# Altium footprint library CUSTOM PCB.PcbLib: 404 footprints (part 17 of 26)
Each footprint in its own frame and in the unit in brackets; x right, y up, seen from the top. Pads: shape width x height; smd on the part's side, far side on the other; paste and mask are expansions set on the pad; w line width, h text height; cw(c..) or ccw(c..) is an arc to the next point about the centre after c.
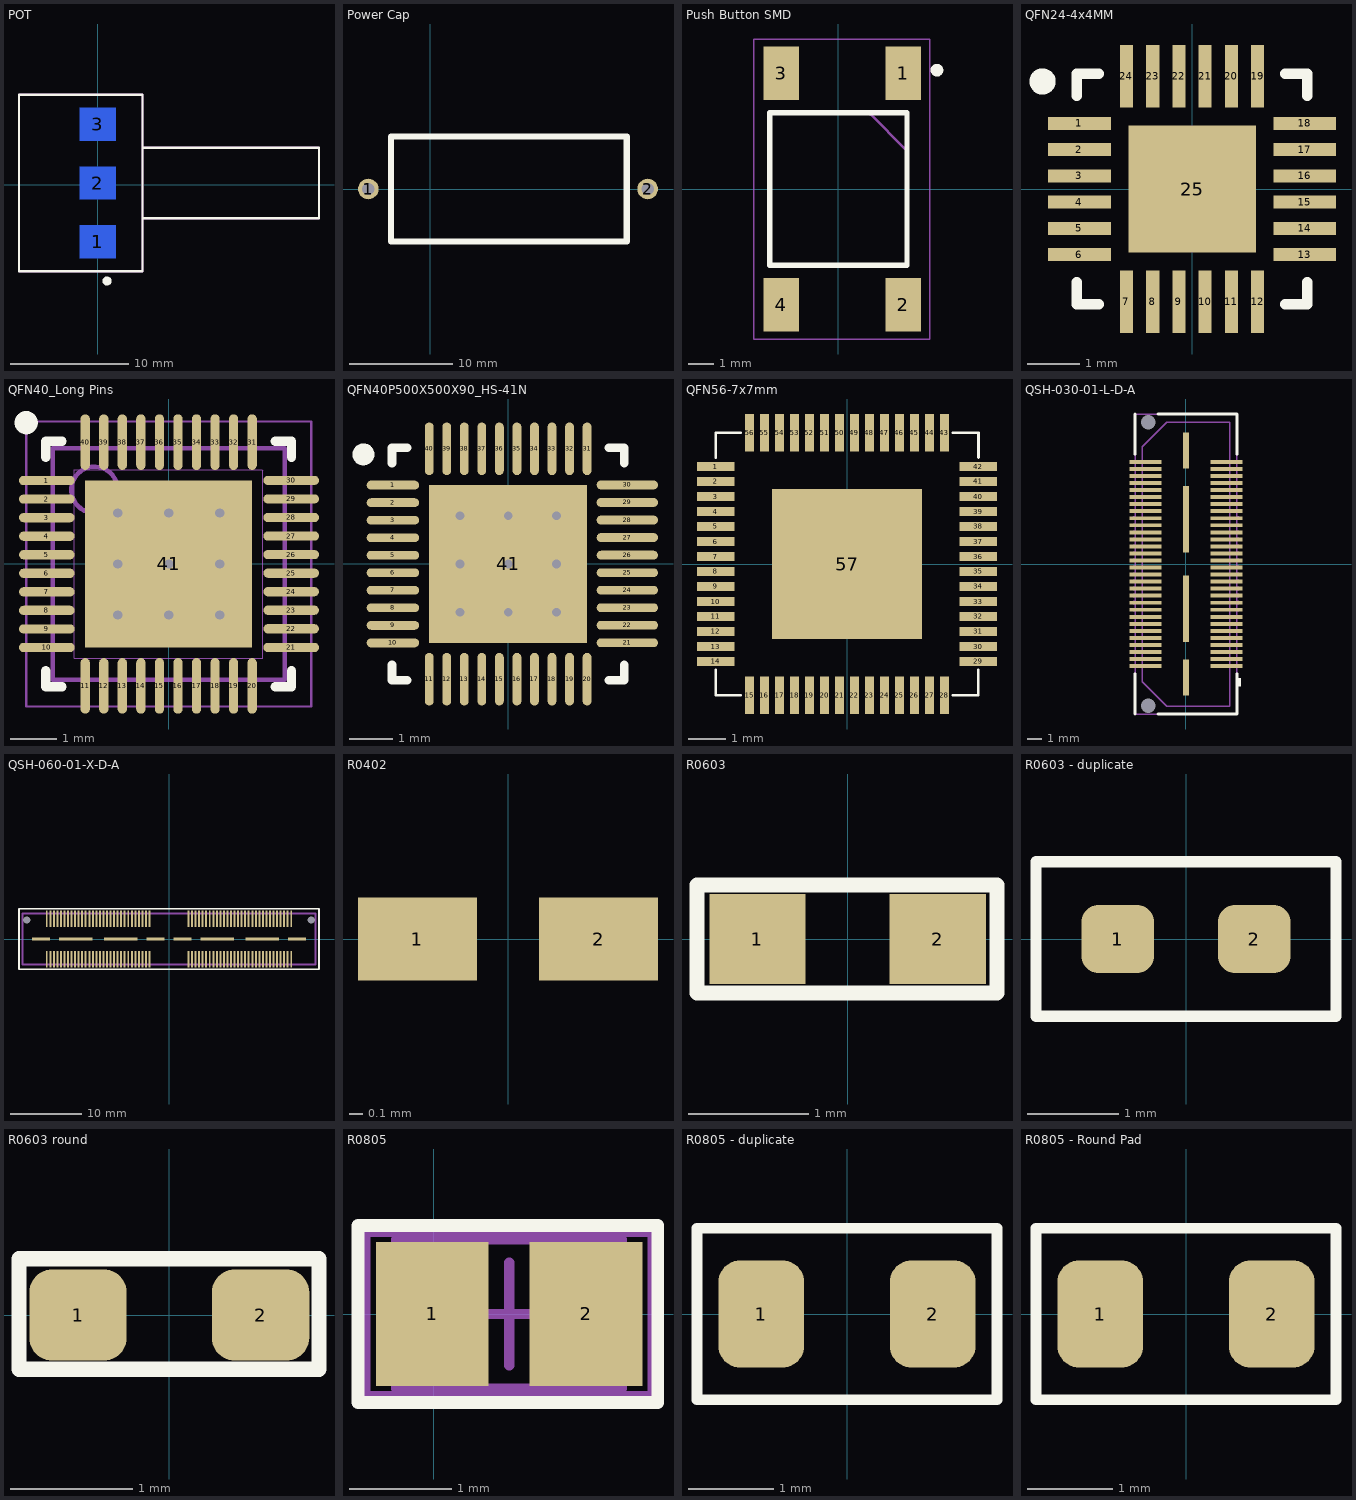
[diagram p16: the footprints below, top view; thin cyan lines are the x and y axes]

## POT [mil]
pads (3):
  rect 120x110 smd far side: 1(0.39,-191.85) 2(0.39,5) 3(0.39,201.85)
Top Overlay:
  circle w15.75: c31.22,-322.83 r7.42
  lines w7.87: 150,-113.11 740.55,-113.11 740.55,123.11 150,123.11 ; -263.39,-290.28 -263.39,300.28 150,300.28 150,-290.28 -263.39,-290.28
Mechanical 15:
  lines w7.87: 150,-113.11 740.55,-113.11 740.55,123.11 150,123.11 ; -263.39,-290.28 150,-290.28 150,300.28 -263.39,300.28 -263.39,-290.28
3D body "POTENCIOMETRO B10K.SLDPRT": height 780.71, standoff -60.63, extent -115,-328.86 835.39,338.86

## Power Cap [mm]
pads (2):
  round 2 hole 1.2: 1(-6,0) 2(21.082,0)
Top Overlay:
  lines w0.6: -3.81,-5.08 -3.81,5.08 10.16,5.08 19.05,5.08 19.05,-5.08 -3.81,-5.08
3D body: height 0.25, standoff 0, extent -3.048,8.128 -3.048,8.128
3D body: height 0.25, standoff 0, extent -3.048,8.128 -3.048,8.128

## Push Button SMD [mm]
pads (4):
  rect 1.4x2.1 smd: 1(2.55,4.55) 2(2.55,-4.55) 3(-2.25,4.55) 4(-2.25,-4.55)
Top Overlay:
  circle w0.25: c3.875,4.675 r0.125
  lines w0.2: -2.7,-3 2.7,-3 2.7,3 -2.7,3 -2.7,-3
Mechanical 15:
  lines w0.1: 1.275,2.925 2.625,1.575 ; -2.7,-3 2.7,-3 2.7,3 -2.7,3 -2.7,-3
Mechanical 20:
  lines w0.05: -3.325,-5.9 3.6,-5.9 3.6,5.9 -3.325,5.9 -3.325,-5.9
3D body "4-1437565-1.stp": height 5.08, standoff 0, extent -2.847,-4.873 3.153,5.127
3D body: height 0.25, standoff 0, extent -6.223,1.651 -6.223,1.651
3D body: height 0.25, standoff 0, extent -7.493,3.175 -7.493,3.175
3D body: height 0.25, standoff 0, extent -7.239,3.048 -7.239,3.048
3D body: height 0.25, standoff 0, extent -7.493,2.667 -7.493,2.667

## QFN24-4x4MM [mm] "QFN24L (4x4x1) 0.5 pitch_STPM32"
height 1
pads (25):
  rect 1.194x0.25 smd: 1(-2.147,1.25) 2(-2.147,0.75) 3(-2.147,0.25) 4(-2.147,-0.25) 5(-2.147,-0.75) 6(-2.147,-1.25) 13(2.147,-1.25) 14(2.147,-0.75) 15(2.147,-0.25) 16(2.147,0.25) 17(2.147,0.75) 18(2.147,1.25)
  rect 0.25x1.194 smd: 7(-1.25,-2.147) 8(-0.75,-2.147) 9(-0.25,-2.147) 10(0.25,-2.147) 11(0.75,-2.147) 12(1.25,-2.147) 19(1.25,2.147) 20(0.75,2.147) 21(0.25,2.147) 22(-0.25,2.147) 23(-0.75,2.147) 24(-1.25,2.147)
  rect 2.43x2.43 smd: 25(0,0)
Top Overlay:
  circle w0.25: c-2.85,2.05 r0.125
  lines w0.2: -2.2,-1.775 -2.2,-2.2 -1.775,-2.2 ; -2.2,1.775 -2.2,2.2 -1.775,2.2 ; 1.775,-2.2 2.2,-2.2 2.2,-1.775 ; 1.775,2.2 2.2,2.2 2.2,1.775
3D body "QFN50P400X400X100_HS-25N.step": height 1, standoff 0, extent -2.051,-2.051 2.051,2.051

## QFN40_Long Pins [mm] "xmc1100"
pads (41):
  oval 1.2x0.2 smd: 1(-2.628,1.8) 2(-2.628,1.4) 3(-2.628,1) 4(-2.628,0.6) 5(-2.628,0.2) 6(-2.628,-0.2) 7(-2.628,-0.6) 8(-2.628,-1) 9(-2.628,-1.4) 10(-2.628,-1.8) 21(2.642,-1.8) 22(2.642,-1.397) 23(2.642,-0.997) 24(2.642,-0.597) 25(2.642,-0.197) 26(2.642,0.203) 27(2.642,0.603) 28(2.642,1.003) 29(2.642,1.403) 30(2.642,1.803)
  oval 0.2x1.2 smd: 11(-1.8,-2.628) 12(-1.4,-2.628) 13(-1,-2.628) 14(-0.6,-2.628) 15(-0.2,-2.628) 16(0.2,-2.628) 17(0.6,-2.628) 18(1,-2.628) 19(1.4,-2.628) 20(1.8,-2.628) 31(1.8,2.628) 32(1.4,2.628) 33(1,2.628) 34(0.6,2.628) 35(0.2,2.628) 36(-0.2,2.628) 37(-0.6,2.628) 38(-1,2.628) 39(-1.4,2.628) 40(-1.8,2.628)
  rect 3.6x3.6 smd: 41(0,0)
via 1.1,-1.1 diameter 0.5 hole 0.2
via 0,-1.1 diameter 0.5 hole 0.2
via -1.1,-1.1 diameter 0.5 hole 0.2
via 1.1,0 diameter 0.5 hole 0.2
via 0,0 diameter 0.5 hole 0.2
via -1.1,0 diameter 0.5 hole 0.2
via 1.1,1.1 diameter 0.5 hole 0.2
via 0,1.1 diameter 0.5 hole 0.2
via -1.1,1.1 diameter 0.5 hole 0.2
Top Overlay:
  circle w0.25: c-3.073,3.048 r0.125
  lines w0.2: -2.65,-2.3 -2.65,-2.65 -2.3,-2.65 ; -2.65,2.3 -2.65,2.65 -2.3,2.65 ; 2.3,-2.65 2.65,-2.65 2.65,-2.3 ; 2.3,2.65 2.65,2.65 2.65,2.3
Mechanical 4:
  lines w0.025: -2.032,-2.032 2.032,-2.032 2.032,2.007 2.007,2.032 -1.803,2.032 -2.032,2.032 -2.032,-2.032
Mechanical 13:
  circle w0.1: c-1.6,1.6 r0.5
  lines w0.1: -2.5,-2.5 2.5,-2.5 2.5,2.5 -2.5,2.5 -2.5,-2.5
Mechanical 15:
  lines w0.05: -3.075,-3.075 3.075,-3.075 3.075,3.075 -3.075,3.075 -3.075,-3.075
  lines w0.1: -0.5,0 0.5,0 ; 0,-0.5 0,0.5
3D body "QFN40P500X500X90_HS-41N.step": height 0.9, standoff 0, extent -2.55,-2.55 2.55,2.55

## QFN40P500X500X90_HS-41N [mm] "QFN, 40-Leads, Body 5.00x5.00mm, Pitch 0.40mm, Thermal Pad 3.60x3.60mm, IPC Medium Density"
height 0.9
pads (41):
  oval 1.2x0.2 smd: 1(-2.628,1.8) 2(-2.628,1.4) 3(-2.628,1) 4(-2.628,0.6) 5(-2.628,0.2) 6(-2.628,-0.2) 7(-2.628,-0.6) 8(-2.628,-1) 9(-2.628,-1.4) 10(-2.628,-1.8)
  oval 0.2x1.2 smd: 11(-1.8,-2.628) 12(-1.4,-2.628) 13(-1,-2.628) 14(-0.6,-2.628) 15(-0.2,-2.628) 16(0.2,-2.628) 17(0.6,-2.628) 18(1,-2.628) 19(1.4,-2.628) 20(1.8,-2.628) 31(1.8,2.628) 32(1.4,2.628) 33(1,2.628) 34(0.6,2.628) 35(0.2,2.628) 36(-0.2,2.628) 37(-0.6,2.628) 38(-1,2.628) 39(-1.4,2.628) 40(-1.8,2.628)
  oval 1.4x0.2 smd: 21(2.718,-1.797) 22(2.718,-1.397) 23(2.718,-0.997) 24(2.718,-0.597) 25(2.718,-0.197) 26(2.718,0.203) 27(2.718,0.603) 28(2.718,1.003) 29(2.718,1.403) 30(2.718,1.803)
  rect 3.6x3.6 smd: 41(0,0)
via 1.1,-1.1 diameter 0.5 hole 0.2
via 0,-1.1 diameter 0.5 hole 0.2
via -1.1,-1.1 diameter 0.5 hole 0.2
via 1.1,0 diameter 0.5 hole 0.2
via 0,0 diameter 0.5 hole 0.2
via -1.1,0 diameter 0.5 hole 0.2
via 1.1,1.1 diameter 0.5 hole 0.2
via 0,1.1 diameter 0.5 hole 0.2
via -1.1,1.1 diameter 0.5 hole 0.2
Top Overlay:
  circle w0.25: c-3.3,2.5 r0.125
  lines w0.2: -2.65,-2.3 -2.65,-2.65 -2.3,-2.65 ; -2.65,2.3 -2.65,2.65 -2.3,2.65 ; 2.3,-2.65 2.65,-2.65 2.65,-2.3 ; 2.3,2.65 2.65,2.65 2.65,2.3
3D body "QFN40P500X500X90_HS-41N.step": height 0.9, standoff 0, extent -2.55,-2.55 2.55,2.55

## QFN56-7x7mm [mm]
pads (57):
  rect 1x0.25 smd: 1(-3.5,2.6) 2(-3.5,2.2) 3(-3.5,1.8) 4(-3.5,1.4) 5(-3.5,1) 6(-3.5,0.6) 7(-3.5,0.2) 8(-3.5,-0.2) 9(-3.5,-0.6) 10(-3.5,-1) 11(-3.5,-1.4) 12(-3.5,-1.8) 13(-3.5,-2.2) 14(-3.5,-2.6) 29(3.5,-2.6) 30(3.5,-2.2) 31(3.5,-1.8) 32(3.5,-1.4) 33(3.5,-1) 34(3.5,-0.6) 35(3.5,-0.2) 36(3.5,0.2) 37(3.5,0.6) 38(3.5,1) 39(3.5,1.4) 40(3.5,1.8) 41(3.5,2.2) 42(3.5,2.6)
  rect 0.25x1 smd: 15(-2.6,-3.5) 16(-2.2,-3.5) 17(-1.8,-3.5) 18(-1.4,-3.5) 19(-1,-3.5) 20(-0.6,-3.5) 21(-0.2,-3.5) 22(0.2,-3.5) 23(0.6,-3.5) 24(1,-3.5) 25(1.4,-3.5) 26(1.8,-3.5) 27(2.2,-3.5) 28(2.6,-3.5) 43(2.6,3.5) 44(2.2,3.5) 45(1.8,3.5) 46(1.4,3.5) 47(1,3.5) 48(0.6,3.5) 49(0.2,3.5) 50(-0.2,3.5) 51(-0.6,3.5) 52(-1,3.5) 53(-1.4,3.5) 54(-1.8,3.5) 55(-2.2,3.5) 56(-2.6,3.5)
  rect 4x4 smd: 57(0,0)
Top Overlay:
  lines w0.076: -3.501,-2.829 -3.501,-3.501 -2.839,-3.501 ; -3.5,2.835 -3.5,3.501 -2.842,3.501 ; 2.827,-3.5 3.499,-3.5 3.499,-2.828 ; 2.827,3.499 3.503,3.499 3.503,2.84
3D body "User Library-QFN56_0_4.x_t": height 0.75, standoff -0.05, extent -3.5,-3.5 3.5,3.5

## QSH-030-01-L-D-A [mm]
pads (66):
  rect 2.27x0.279 smd: 1(2.865,-7.25) 2(-2.865,-7.25) 3(2.865,-6.75) 4(-2.865,-6.75) 5(2.865,-6.25) 6(-2.865,-6.25) 7(2.865,-5.75) 8(-2.865,-5.75) 9(2.865,-5.25) 10(-2.865,-5.25) 11(2.865,-4.75) 12(-2.865,-4.75) 13(2.865,-4.25) 14(-2.865,-4.25) 15(2.865,-3.75) 16(-2.865,-3.75) 17(2.865,-3.25) 18(-2.865,-3.25) 19(2.865,-2.75) 20(-2.865,-2.75) 21(2.865,-2.25) 22(-2.865,-2.25) 23(2.865,-1.75) 24(-2.865,-1.75) 25(2.865,-1.25) 26(-2.865,-1.25) 27(2.865,-0.75) 28(-2.865,-0.75) 29(2.865,-0.25) 30(-2.865,-0.25) 31(2.865,0.25) 32(-2.865,0.25) 33(2.865,0.75) 34(-2.865,0.75) 35(2.865,1.25) 36(-2.865,1.25) 37(2.865,1.75) 38(-2.865,1.75) 39(2.865,2.25) 40(-2.865,2.25) 41(2.865,2.75) 42(-2.865,2.75) 43(2.865,3.25) 44(-2.865,3.25) 45(2.865,3.75) 46(-2.865,3.75) 47(2.865,4.25) 48(-2.865,4.25) 49(2.865,4.75) 50(-2.865,4.75) 51(2.865,5.25) 52(-2.865,5.25) 53(2.865,5.75) 54(-2.865,5.75) 55(2.865,6.25) 56(-2.865,6.25) 57(2.865,6.75) 58(-2.865,6.75) 59(2.865,7.25) 60(-2.865,7.25)
  round 0 hole 1.02 unplated mask+0: MH1(-2.67,-10.065) MH2(-2.67,10.065)
  rect 0.43x2.54 smd: MP1(0,-8.065) MP4(0,8.065)
  rect 0.43x4.7 smd: MP2(0,-3.175) MP3(0,3.175)
Top Overlay:
  region: 3.9,-8.1 3.62,-8.1 3.62,-8.7 3.9,-8.7
  lines w0.2: -3.62,-10.655 -3.62,-7.789 ; -3.62,7.789 -3.62,10.655 ; -2,-10.655 3.62,-10.655 3.62,-7.789 ; -2,10.655 3.62,10.655 3.62,7.789
Mechanical 5:
  drawing of 190 lines, arcs and shapes, not listed
  text ".Designator" at 0.368,0.927 h1.02
3D body "Samtec-QSH-030-01-L-D-A.stp": height 3.25, standoff -0.75, extent -3.746,-10.655 3.747,10.655

## QSH-060-01-X-D-A [mil]
pads (130):
  rect 11x90 smd mask+2: 1(-679.25,-112.8) 2(-679.25,112.8) 3(-659.57,-112.8) 4(-659.57,112.8) 5(-639.88,-112.8) 6(-639.88,112.8) 7(-620.18,-112.8) 8(-620.18,112.8) 9(-600.5,-112.8) 10(-600.5,112.8) 11(-580.8,-112.8) 12(-580.8,112.8) 13(-561.12,-112.8) 14(-561.12,112.8) 15(-541.42,-112.8) 16(-541.42,112.8) 17(-521.74,-112.8) 18(-521.74,112.8) 19(-502.05,-112.8) 20(-502.05,112.8) 21(-482.36,-112.8) 22(-482.36,112.8) 23(-462.67,-112.8) 24(-462.67,112.8) 25(-442.98,-112.8) 26(-442.98,112.8) 27(-423.29,-112.8) 28(-423.29,112.8) 29(-403.6,-112.8) 30(-403.6,112.8) 31(-383.9,-112.8) 32(-383.9,112.8) 33(-364.21,-112.8) 34(-364.21,112.8) 35(-344.52,-112.8) 36(-344.52,112.8) 37(-324.83,-112.8) 38(-324.83,112.8) 39(-305.14,-112.8) 40(-305.14,112.8) 41(-285.45,-112.8) 42(-285.45,112.8) 43(-265.76,-112.8) 44(-265.76,112.8) 45(-246.07,-112.8) 46(-246.07,112.8) 47(-226.38,-112.8) 48(-226.38,112.8) 49(-206.69,-112.8) 50(-206.69,112.8) 51(-187,-112.8) 52(-187,112.8) 53(-167.31,-112.8) 54(-167.31,112.8) 55(-147.62,-112.8) 56(-147.62,112.8) 57(-127.94,-112.8) 58(-127.94,112.8) 59(-108.25,-112.8) 60(-108.25,112.8) 61(108.25,-112.8) 62(108.25,112.8) 63(127.94,-112.8) 64(127.94,112.8) 65(147.62,-112.8) 66(147.62,112.8) 67(167.31,-112.8) 68(167.31,112.8) 69(187,-112.8) 70(187,112.8) 71(206.69,-112.8) 72(206.69,112.8) 73(226.38,-112.8) 74(226.38,112.8) 75(246.07,-112.8) 76(246.07,112.8) 77(265.76,-112.8) 78(265.76,112.8) 79(285.45,-112.8) 80(285.45,112.8) 81(305.14,-112.8) 82(305.14,112.8) 83(324.83,-112.8) 84(324.83,112.8) 85(344.52,-112.8) 86(344.52,112.8) 87(364.21,-112.8) 88(364.21,112.8) 89(383.9,-112.8) 90(383.9,112.8) 91(403.6,-112.8) 92(403.6,112.8) 93(423.29,-112.8) 94(423.29,112.8) 95(442.98,-112.8) 96(442.98,112.8) 97(462.67,-112.8) 98(462.67,112.8) 99(482.36,-112.8) 100(482.36,112.8) 101(502.05,-112.8) 102(502.05,112.8) 103(521.74,-112.8) 104(521.74,112.8) 105(541.42,-112.8) 106(541.42,112.8) 107(561.12,-112.8) 108(561.12,112.8) 109(580.8,-112.8) 110(580.8,112.8) 111(600.5,-112.8) 112(600.5,112.8) 113(620.18,-112.8) 114(620.18,112.8) 115(639.88,-112.8) 116(639.88,112.8) 117(659.57,-112.8) 118(659.57,112.8) 119(679.25,-112.8) 120(679.25,112.8)
  rect 100x17 smd mask+2: G1(-711.25,0) G4(-76.25,0) G5(76.25,0) G8(711.25,0)
  rect 185x17 smd mask+2: G2(-518.75,0) G3(-268.75,0) G6(268.75,0) G7(518.75,0)
  round 0 hole 40 unplated: MH1(-790,105) MH2(790,105)
Top Overlay:
  lines w10: -833.5,-167.8 -833.5,167.8 833.5,167.8 833.5,-167.8 -833.5,-167.8
Mechanical 1:
  lines w10: -813.5,-142.5 -813.5,142.5 813.5,142.5 813.5,-142.5 -813.5,-142.5
  text "J1" at -19.57,-20 h30
3D body "QSH-060-01-L-D-A-TR.x_t": height 120, standoff -37.5, extent -813.25,-147.52 813.25,147.52

## R0402 [mm]
pads (2):
  rect 0.859x0.602 smd paste+0 mask+0: 1(-0.654,0) 2(0.654,0)
3D body "RC0402N-M.step": height 0.63, standoff -0.08, extent -0.525,-0.25 0.525,0.25

## R0603 [mm]
pads (2):
  rect 0.8x0.75 smd: 1(-0.75,0) 2(0.75,0)
Top Overlay:
  lines w0.125: -1.252,-0.45 1.243,-0.45 1.243,0.45 -1.252,0.45 -1.252,-0.45
3D body "SMD R-0603.STEP": height 0.45, standoff -0.01, extent -0.8,-0.4 0.8,0.4

## R0603 - duplicate [mm]
pads (2):
  rrect50% 0.8x0.75 smd: 1(-0.75,0) 2(0.75,0)
Top Overlay:
  lines w0.125: -1.65,-0.85 -1.65,0.85 1.65,0.85 1.65,-0.85 -1.65,-0.85
3D body "SMD R-0603.STEP": height 0.45, standoff -0.01, extent -0.8,-0.4 0.8,0.4

## R0603 round [mm]
pads (2):
  rrect50% 0.8x0.75 smd: 1(-0.75,0) 2(0.75,0)
Top Overlay:
  lines w0.125: -1.235,-0.446 -1.235,0.463 1.23,0.463 1.23,-0.446 -1.235,-0.446
3D body "SMD R-0603.STEP": height 0.45, standoff -0.01, extent -0.8,-0.4 0.8,0.4

## R0805 [mm]
pads (2):
  rect 1.1x1.4 smd: 1(-0.013,0) 2(1.487,0)
Top Overlay:
  lines w0.125: -0.737,-0.864 -0.737,0.864 2.184,0.864 2.184,-0.864 -0.737,-0.864
Mechanical 13:
  lines w0.1: -0.363,-0.725 1.837,-0.725 1.837,0.725 -0.363,0.725 -0.363,-0.725
Mechanical 15:
  lines w0.1: 0.237,0 1.237,0 ; 0.737,-0.5 0.737,0.5 ; -0.663,-0.8 2.137,-0.8 2.137,0.8 -0.663,0.8 -0.663,-0.8
3D body: height 0.25, standoff 0, extent 0.305,1.6 0.305,1.6
3D body "0805_RES.stp": height 0.53, standoff -0.08, extent -0.289,-0.615 1.711,0.635

## R0805 - duplicate [mm]
pads (2):
  rrect50% 1x1.25 smd: 1(-1,0) 2(1,0)
Top Overlay:
  lines w0.125: -1.75,-1 1.75,-1 1.75,1 -1.75,1 -1.75,-1
3D body "R-0805.STEP": height 0.6, standoff 0, extent -1,-0.625 1,0.625

## R0805 - Round Pad [mm]
pads (2):
  rrect50% 1x1.25 smd: 1(-1,0) 2(1,0)
Top Overlay:
  lines w0.125: -1.75,-1 1.75,-1 1.75,1 -1.75,1 -1.75,-1
3D body "R-0805.STEP": height 0.6, standoff 0, extent -1,-0.625 1,0.625